# Altium footprint library Connectors.PcbLib: 245 footprints (part 3 of 16)
Each footprint in its own frame and in the unit in brackets; x right, y up, seen from the top. Pads: shape width x height; smd on the part's side, far side on the other; paste and mask are expansions set on the pad; w line width, h text height; cw(c..) or ccw(c..) is an arc to the next point about the centre after c.
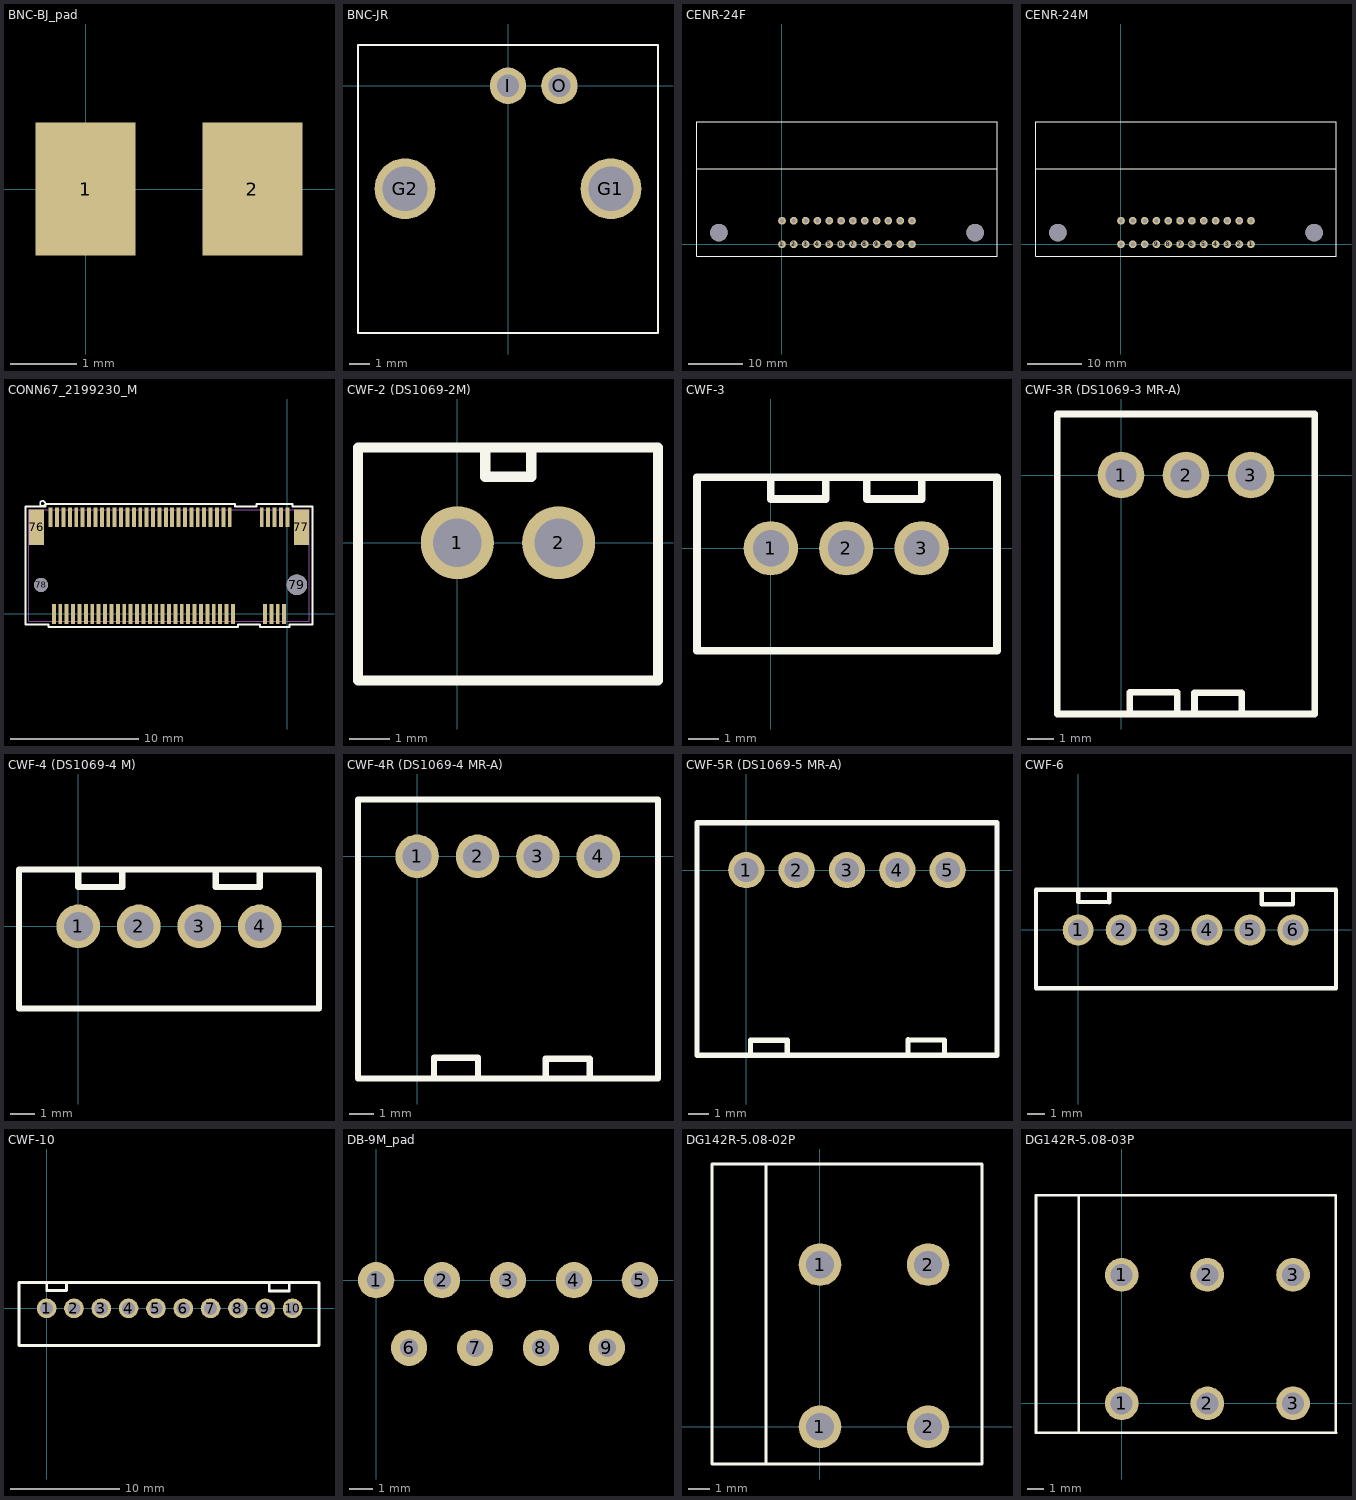
[diagram p2: the footprints below, top view; thin cyan lines are the x and y axes]

## BNC-BJ_pad [mm]
pads (2):
  rect 1.5x2 smd: 1(0,0) 2(2.5,0)

## BNC-JR [mm] "BNC rounded"
height 13
pads (4):
  round 3 hole 2.2: G1(5.08,-5.08) G2(-5.08,-5.08)
  round 1.8 hole 1.1: I(0,0) O(2.54,0)
Top Overlay:
  lines w0.1: -7.4,-12.2 7.4,-12.2 7.4,2.02 -7.4,2.02 -7.4,-12.2
3D body "BNC-JR.STEP": height 13, standoff -4.2, extent -7.4,-32.88 7.4,2.02

## CENR-24F [mm]
pads (26):
  round 1.4 hole 0.8: 1(0,0) 2(2.16,0) 3(4.32,0) 4(6.48,0) 5(8.64,0) 6(10.8,0) 7(12.96,0) 8(15.12,0) 9(17.28,0) 10(19.44,0) 11(21.6,0) 12(23.76,0) 13(0,4.29) 14(2.16,4.29) 15(4.32,4.29) 16(6.48,4.29) 17(8.64,4.29) 18(10.8,4.29) 19(12.96,4.29) 20(15.12,4.29) 21(17.28,4.29) 22(19.44,4.29) 23(21.6,4.29) 24(23.76,4.29)
  round 3.2 hole 3.2: ""(-11.53,2.145) ""(35.29,2.145)
Top Overlay:
  lines w0.15: -15.51,13.84 -14.17,13.84 39.28,13.84 ; -15.53,-2.155 -11.53,-2.155 35.29,-2.155 39.29,-2.155 39.29,22.345 -15.53,22.345 -15.53,-2.155
3D body "centronics_a-57_24fr_kl.stp": height 15.85, standoff -4.42, extent -18.256,-2.27 41.996,39.341

## CENR-24M [mm]
pads (26):
  round 1.4 hole 0.8: 1(23.76,0) 2(21.6,0) 3(19.44,0) 4(17.28,0) 5(15.12,0) 6(12.96,0) 7(10.8,0) 8(8.64,0) 9(6.48,0) 10(4.32,0) 11(2.16,0) 12(0,0) 13(23.76,4.29) 14(21.6,4.29) 15(19.44,4.29) 16(17.28,4.29) 17(15.12,4.29) 18(12.96,4.29) 19(10.8,4.29) 20(8.64,4.29) 21(6.48,4.29) 22(4.32,4.29) 23(2.16,4.29) 24(0,4.29)
  round 3.2 hole 3.2: ""(-11.53,2.145) ""(35.29,2.145)
Top Overlay:
  lines w0.15: -15.51,13.84 -14.17,13.84 39.28,13.84 ; -15.53,-2.155 -11.53,-2.155 35.29,-2.155 39.29,-2.155 39.29,22.345 -15.53,22.345 -15.53,-2.155

## CONN67_2199230_M [mil] "M.2 slot key M"
pads (71):
  rect 12x61 smd paste+0 mask+0: 1(-728.35,297.24) 2(-718.5,0) 3(-708.66,297.24) 4(-698.82,0) 5(-688.98,297.24) 6(-679.13,0) 7(-669.29,297.24) 8(-659.45,0) 9(-649.61,297.24) 10(-639.76,0) 11(-629.92,297.24) 12(-620.08,0) 13(-610.24,297.24) 14(-600.39,0) 15(-590.55,297.24) 16(-580.71,0) 17(-570.87,297.24) 18(-561.02,0) 19(-551.18,297.24) 20(-541.34,0) 21(-531.5,297.24) 22(-521.65,0) 23(-511.81,297.24) 24(-501.97,0) 25(-492.13,297.24) 26(-482.28,0) 27(-472.44,297.24) 28(-462.6,0) 29(-452.76,297.24) 30(-442.91,0) 31(-433.07,297.24) 32(-423.23,0) 33(-413.39,297.24) 34(-403.54,0) 35(-393.7,297.24) 36(-383.86,0) 37(-374.02,297.24) 38(-364.17,0) 39(-354.33,297.24) 40(-344.49,0) 41(-334.65,297.24) 42(-324.8,0) 43(-314.96,297.24) 44(-305.12,0) 45(-295.28,297.24) 46(-285.43,0) 47(-275.59,297.24) 48(-265.75,0) 49(-255.91,297.24) 50(-246.06,0) 51(-236.22,297.24) 52(-226.38,0) 53(-216.54,297.24) 54(-206.69,0) 55(-196.85,297.24) 56(-187.01,0) 57(-177.17,297.24) 58(-167.32,0) 67(-78.74,297.24) 68(-68.9,0) 69(-59.06,297.24) 70(-49.21,0) 71(-39.37,297.24) 72(-29.53,0) 73(-19.68,297.24) 74(-9.84,0) 75(0,297.24)
  rect 47x108 smd: 76(-771.65,266.73) 77(43.31,266.73)
  round 43 hole 43: 78(-757.87,89.57)
  round 63 hole 63: 79(29.53,89.57)
Top Overlay:
  circle w3.94: c-753.07,339.8 r7.87
  lines w6: -805.17,202.73 -805.17,-32.88 -734.5,-32.88 -734.5,-40.5 -151.32,-40.5 -151.32,-32.88 -84.9,-32.88 -84.9,-40.5 6.16,-40.5 6.16,-32.88 76.83,-32.88 76.83,202.73 76.81,202.73 76.81,330.73 16,330.73 16,337.74 -94.74,337.74 -94.74,330.12 -161.17,330.12 -161.17,337.74 -744.35,337.74 -744.35,330.73 -805.15,330.73 -805.15,202.73 ; -805.17,202.73 -805.15,202.73
Mechanical 13:
  lines w1: -795.17,-22.88 -795.17,320.12 66.83,320.12 66.83,-22.88 -795.17,-22.88
3D body: height 10, standoff 0, extent 0,0 10,10
3D body "c-1-2199230-4-b2-3d.stp": height 160.83, standoff -24.21, extent -795.67,-21.9 66.53,320.62

## CWF-2 (DS1069-2M) [mm]
pads (2):
  round 1.8 hole 1.2: 1(0,0) 2(2.5,0)
Top Overlay:
  lines w0.254: 1.82,2.34 1.82,1.63 0.69,1.63 0.69,2.35 ; 4.95,2.3 4.95,-3.4 0,-3.4 -2.45,-3.4 -2.45,0 -2.45,2.35 0.69,2.35 ; 4.95,2.35 0.69,2.35
3D body "User Library-CWF-2.step": height 7, standoff -3.5, extent -2.5,-3.56 5,2.19

## CWF-3 [mm]
pads (3):
  round 1.8 hole 1.2: 1(0,0) 2(2.5,0) 3(5,0)
Top Overlay:
  lines w0.254: 1.81,1.63 0,1.63 0,2.35 ; 1.82,1.62 1.82,2.34 ; 3.18,1.62 3.18,2.34 ; 3.19,1.63 5,1.63 5,2.35 ; 0,2.35 7.5,2.35 7.5,1.45 7.5,-3.4 0,-3.4 -2.45,-3.4 -2.45,0 -2.45,2.35 0,2.35
3D body "User Library-CWF-3.STEP": height 7, standoff -3.5, extent -2.5,-3.3 7.5,2.45

## CWF-3R (DS1069-3 MR-A) [mm]
pads (3):
  round 1.8 hole 1.2: 1(0,0) 2(2.5,0) 3(5,0)
Top Overlay:
  lines w0.254: -2.45,-9.2 0,-9.2 7.45,-9.2 7.45,2.35 0,2.35 -2.45,2.35 -2.45,0 -2.45,-3.4 -2.45,-9.198 ; 0.342,-9.087 0.342,-8.367 2.162,-8.367 2.162,-9.077 ; 2.828,-9.087 2.828,-8.377 4.648,-8.377 4.648,-9.097

## CWF-4 (DS1069-4 M) [mm]
pads (4):
  round 1.8 hole 1.2: 1(0,0) 2(2.5,0) 3(5,0) 4(7.5,0)
Top Overlay:
  lines w0.254: 1.81,1.63 0,1.63 0,2.35 ; 1.82,1.62 1.82,2.34 ; 5.68,1.62 5.68,2.34 ; 5.69,1.63 7.5,1.63 7.5,2.35 ; 0,2.35 -2.45,2.35 -2.45,0 -2.45,-3.4 0,-3.4 9.95,-3.4 9.95,0 9.95,2.35 0,2.35
3D body "User Library-CWF-4.step": height 7, standoff -3.5, extent -2.39,-3.54 10.01,2.21

## CWF-4R (DS1069-4 MR-A) [mm]
pads (4):
  round 1.8 hole 1.2: 1(0,0) 2(2.5,0) 3(5,0) 4(7.5,0)
Top Overlay:
  lines w0.254: -2.45,-9.2 0,-9.2 9.969,-9.2 9.974,-9.195 9.974,2.35 0,2.35 -2.45,2.35 -2.45,0 -2.45,-3.4 -2.45,-9.198 ; 0.694,-9.061 0.694,-8.341 2.504,-8.341 ; 2.514,-9.051 2.514,-8.331 ; 5.325,-9.094 5.325,-8.374 ; 5.335,-8.384 7.145,-8.384 7.145,-9.104
3D body "User Library-DS1069-4 MR TypeA.step": height 5.93, standoff -3.22, extent -2.431,-9.2 9.969,2.3

## CWF-5R (DS1069-5 MR-A) [mm]
pads (5):
  round 1.8 hole 1.2: 1(0,0) 2(2.5,0) 3(5,0) 4(7.5,0) 5(10,0)
Top Overlay:
  lines w0.15: 12.448,-9.2 12.448,2.348
  lines w0.254: -2.45,-9.2 0,-9.2 10,-9.2 12.448,-9.2 ; -2.45,-9.198 -2.45,-3.4 -2.45,0 -2.45,2.35 0,2.35 12.45,2.35 12.45,0 12.45,-3.4 12.45,-9.198 ; 0.211,-9.172 0.211,-8.452 2.021,-8.452 ; 2.031,-9.162 2.031,-8.442 ; 8.021,-9.144 8.021,-8.424 ; 8.031,-8.434 9.841,-8.434 9.841,-9.154
3D body "User Library-DS1069-4 MR TypeA.step": height 5.93, standoff -3.22, extent -0.007,-9.2 12.393,2.3
3D body "User Library-DS1069-4 MR TypeA.step": height 5.93, standoff -3.22, extent -2.431,-9.2 9.969,2.3

## CWF-6 [mm]
pads (6):
  round 1.8 hole 1.2: 1(0,0) 2(2.5,0) 3(5,0) 4(7.5,0) 5(10,0) 6(12.5,0)
Top Overlay:
  lines w0.254: 1.81,1.63 0,1.63 0,2.35 ; 1.82,1.62 1.82,2.34 ; 10.68,1.49 10.68,2.21 ; 10.69,1.5 12.5,1.5 12.5,2.22 ; 0,2.35 15,2.35 15,-3.4 0,-3.4 -2.45,-3.4 -2.45,0 -2.45,2.35 0,2.35
3D body "User Library-CWF-6.STEP": height 7, standoff -3.5, extent -2.5,-3.55 15,2.2

## CWF-10 [mm]
pads (10):
  round 1.8 hole 1.2: 1(0,0) 2(2.5,0) 3(5,0) 4(7.5,0) 5(10,0) 6(12.5,0) 7(15,0) 8(17.5,0) 9(20,0) 10(22.5,0)
Top Overlay:
  lines w0.254: -2.53,-3.4 0,-3.4 24.92,-3.4 24.92,2.35 0,2.35 ; -2.53,-3.39 -2.53,0.01 -2.53,2.36 ; -2.53,2.35 0,2.35 ; 1.81,1.63 0,1.63 0,2.35 ; 1.82,1.62 1.82,2.34 ; 20.37,1.58 20.37,2.3 ; 20.38,1.59 22.19,1.59 22.19,2.31
3D body "User Library-CWF-10.STEP": height 7, standoff -3.5, extent -2.59,-3.38 24.91,2.37

## DB-9M_pad [mil]
pads (9):
  round 60 hole 30: 1(0,0) 2(109.06,0) 3(218.11,0) 4(327.17,0) 5(436.22,0) 6(54.53,-111.81) 7(163.58,-111.81) 8(272.64,-111.81) 9(381.69,-111.81)

## DG142R-5.08-02P [mm]
pads (4):
  round 2 hole 1.3: 1(0,0) 1(0.001,7.618) 2(5.08,0) 2(5.08,7.62)
Top Overlay:
  lines w0.15: -2.541,-1.752 -5.081,-1.752 -5.081,-0.002 -5.081,12.348 -2.541,12.348 ; -2.54,-1.752 -2.54,0 -2.54,12.348 0.001,12.348 7.621,12.348 7.621,-0.002 7.621,-1.752 0.001,-1.752 -2.54,-1.752
3D body "DG142R-2.stp": height 13.4, standoff -3.5, extent -4.961,-1.732 7.639,12.368

## DG142R-5.08-03P [mm]
pads (6):
  round 2 hole 1.3: 1(0,0) 1(0.001,7.618) 2(5.08,0) 2(5.08,7.62) 3(10.159,0.002) 3(10.159,7.622)
Top Overlay:
  lines w0.15: -2.541,-1.752 -5.081,-1.752 -5.081,-0.002 -5.081,12.348 -2.541,12.348 ; 12.7,-1.75 12.7,0 12.7,12.335 12.687,12.348 0.001,12.348 -2.54,12.348 -2.54,0 -2.54,-1.752 0.001,-1.752 12.707,-1.752
3D body "DG142R-3.stp": height 13.4, standoff -3.5, extent -5.181,-1.787 12.499,12.313